# Altium footprint library PcbLib1.PcbLib: 62 footprints (part 2 of 4)
Each footprint in its own frame and in the unit in brackets; x right, y up, seen from the top. Pads: shape width x height; smd on the part's side, far side on the other; paste and mask are expansions set on the pad; w line width, h text height; cw(c..) or ccw(c..) is an arc to the next point about the centre after c.
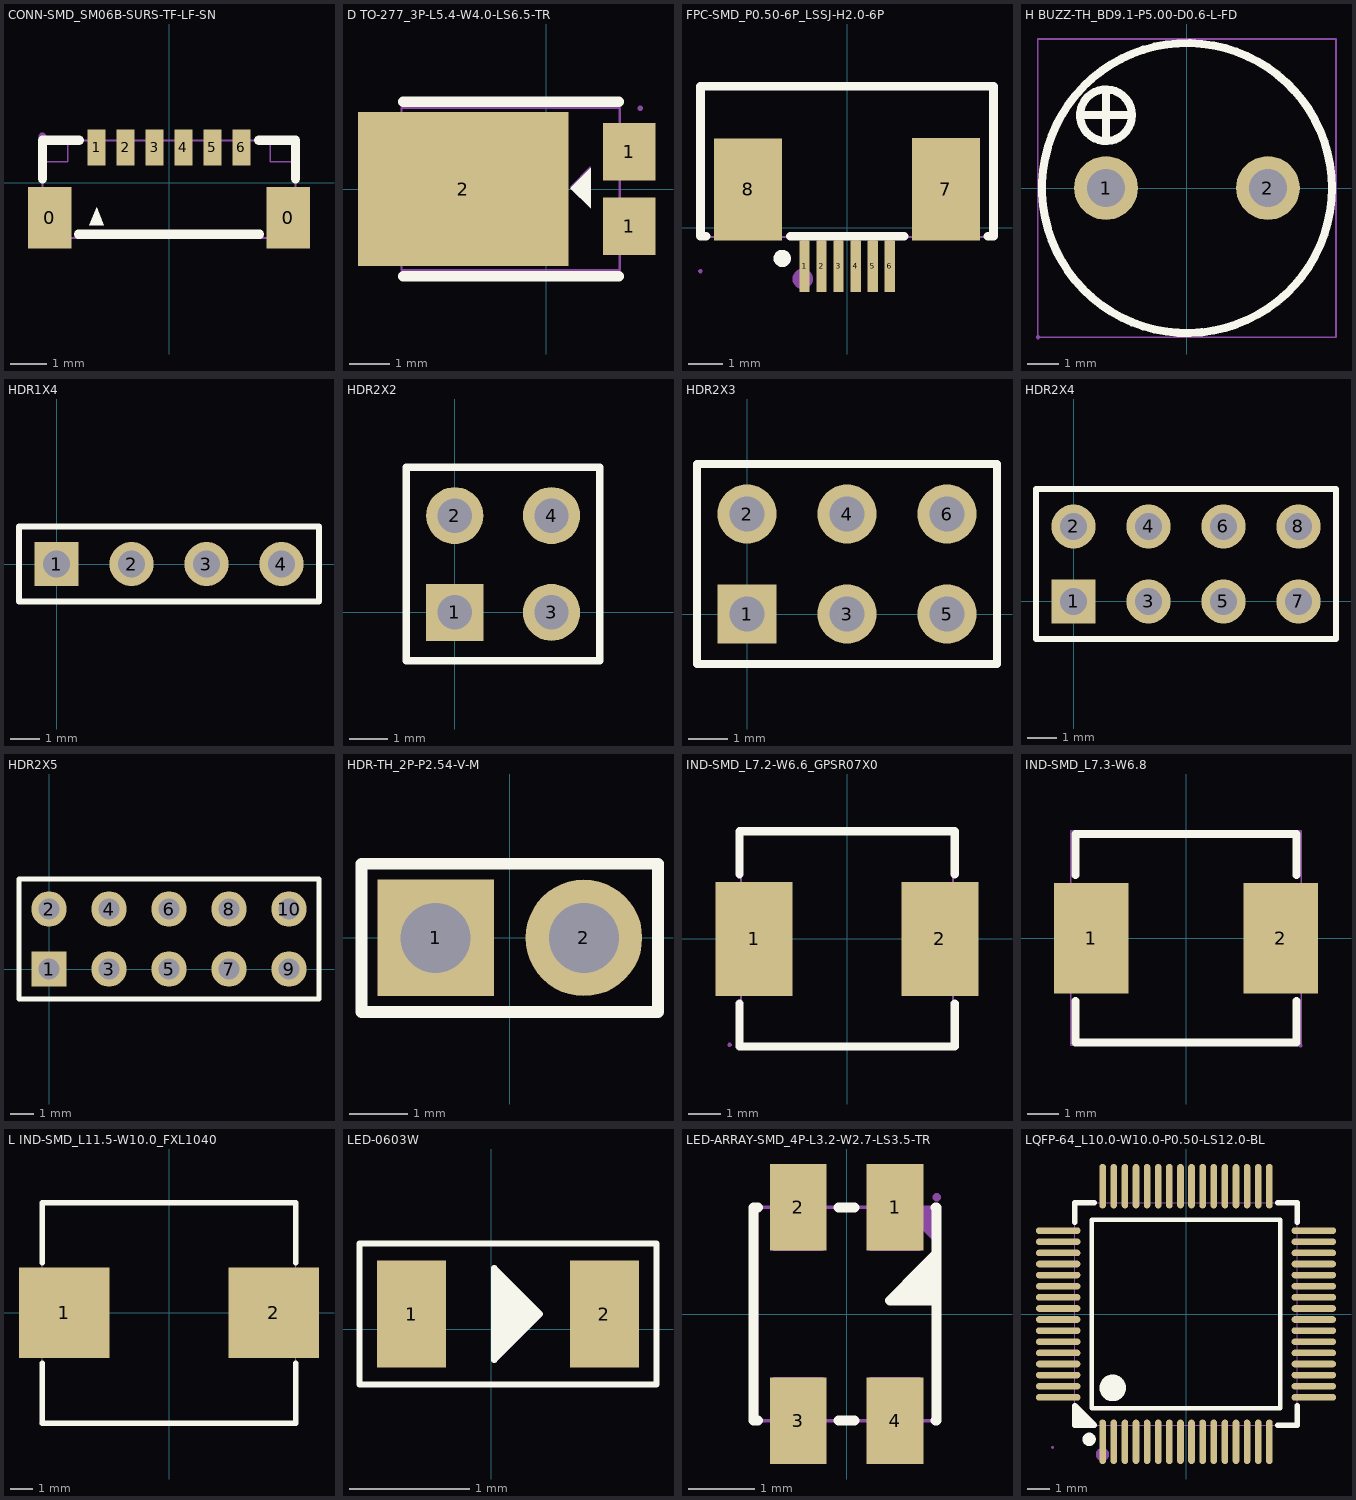
[diagram p1: the footprints below, top view; thin cyan lines are the x and y axes]

## CONN-SMD_SM06B-SURS-TF-LF-SN [mm]
pads (8):
  rect 1.2x1.7 smd: 0(-3.3,-0.975) 0(3.3,-0.975)
  rect 0.5x1 smd: 1(-2,0.975) 2(-1.2,0.975) 3(-0.4,0.975) 4(0.4,0.975) 5(1.2,0.975) 6(2,0.975)
Top Overlay:
  region: -2.2,-1.175 -1.8,-1.175 -2,-0.675
  lines w0.254: -3.5,0.106 -3.5,1.175 -2.481,1.175 ; -2.5,-1.425 2.5,-1.425 ; 2.481,1.175 3.5,1.175 3.5,0.106
Mechanical 15:
  region: -3.3,-1.53 -3.5,-1.53 -3.5,-0.53 -3.3,-0.53
  region: 3.3,-0.53 3.5,-0.53 3.5,-1.53 3.3,-1.53
  region: -2.1,1.275 -1.9,1.275 -1.9,0.675 -2.1,0.675
  region: -1.3,1.275 -1.1,1.275 -1.1,0.675 -1.3,0.675
  region: -0.5,1.275 -0.3,1.275 -0.3,0.675 -0.5,0.675
  region: 0.3,1.275 0.5,1.275 0.5,0.675 0.3,0.675
  region: 1.1,1.275 1.3,1.275 1.3,0.675 1.1,0.675
  region: 1.9,1.275 2.1,1.275 2.1,0.675 1.9,0.675
  region: -3.4,1.275 -3.4,1.316 -3.459,1.375 -3.541,1.375 -3.6,1.316 -3.6,1.275 -3.6,1.234 -3.541,1.175 -3.459,1.175 -3.4,1.234
  lines w0.051: -3.5,-1.53 -3.5,0.58 -2.8,0.58 -2.8,1.17 2.8,1.17 2.8,0.58 3.5,0.58 3.5,-1.53 -3.5,-1.53

## D TO-277_3P-L5.4-W4.0-LS6.5-TR [mm]
pads (3):
  rect 1.29x1.422 smd mask+0.051: 1(2.054,-0.92) 1(2.054,0.92)
  rect 5.2x3.8 smd mask+0.051: 2(-2.054,0)
Top Overlay:
  region: 0.599,0.02 1.099,0.52 1.099,-0.48
  lines w0.254: -3.537,-2.159 1.797,-2.159 ; -3.537,2.159 1.797,2.159
Mechanical 6:
  region: 0.589,0.06 1.089,0.56 1.089,-0.44
Mechanical 15:
  region: 2.387,2 2.387,2.025 2.352,2.06 2.302,2.06 2.267,2.025 2.267,2 2.267,1.975 2.302,1.94 2.352,1.94 2.387,1.975 2.387,2
  region: -3.401,-0.86 -4.221,-0.86 -4.221,0.94 -3.401,0.94 -3.401,1.6 0.179,1.6 0.179,-1.48 -3.401,-1.48
  region: 1.777,-0.47 2.327,-0.47 2.327,-1.37 1.777,-1.37
  region: 1.777,1.37 2.327,1.37 2.327,0.47 1.777,0.47
  lines w0.051: -3.581,-2 -3.581,2 1.819,2 1.819,-2 -3.581,-2
3D body "TO-277B.STEP": height 1.2, standoff 0, extent -4.445,-2.375 2.305,2.375

## FPC-SMD_P0.50-6P_LSSJ-H2.0-6P [mm]
pads (8):
  rect 0.3x1.5 smd: 1(-1.245,-1.13) 2(-0.745,-1.13) 3(-0.245,-1.13) 4(0.255,-1.13) 5(0.755,-1.13) 6(1.255,-1.13)
  rect 2x3 smd: 7(2.901,1.13) 8(-2.901,1.124)
Top Overlay:
  circle w0.254: c-1.9,-0.9 r0.127
  lines w0.254: -4.133,-0.246 -4.3,-0.246 -4.3,4.154 4.3,4.154 4.3,-0.246 4.132,-0.246 ; -1.669,-0.246 1.671,-0.246
Mechanical 6:
  circle w0.3: c-1.3,-1.5 r0.15
Mechanical 15:
  region: 1.95,2.356 3.75,2.356 3.75,-0.265 1.95,-0.265
  region: -3.751,2.35 -1.951,2.35 -1.951,-0.271 -3.751,-0.271
  region: -1.345,-0.221 -1.145,-0.221 -1.145,-1.271 -1.345,-1.271
  region: -0.845,-0.221 -0.645,-0.221 -0.645,-1.271 -0.845,-1.271
  region: -0.345,-0.221 -0.145,-0.221 -0.145,-1.271 -0.345,-1.271
  region: 0.155,-0.221 0.355,-0.221 0.355,-1.271 0.155,-1.271
  region: 0.655,-0.221 0.855,-0.221 0.855,-1.271 0.655,-1.271
  region: 1.155,-0.221 1.355,-0.221 1.355,-1.271 1.155,-1.271
  region: -4.24,-1.271 -4.24,-1.246 -4.275,-1.211 -4.325,-1.211 -4.36,-1.246 -4.36,-1.271 -4.36,-1.296 -4.325,-1.331 -4.275,-1.331 -4.24,-1.296
  lines w0.051: -4.3,-0.271 4.3,-0.271 4.3,4.129 -4.3,4.129 -4.3,-0.271
3D body "SMD,P=0.5mm.STEP": height 2.01, standoff 0, extent -4.3,-1.717 4.3,3.683

## H BUZZ-TH_BD9.1-P5.00-D0.6-L-FD [mm]
pads (2):
  round 2 hole 1.2 mask+0.051: 1(-2.54,0) 2(2.54,0)
Top Overlay:
  circle w0.254: c0,0 r4.55
  circle w0.254: c-2.54,2.286 r0.813
  lines w0.254: -3.302,2.286 -1.778,2.286 ; -2.54,1.524 -2.54,3.048
Mechanical 15:
  region: -2.04,0 -2.04,0.099 -2.116,0.283 -2.257,0.424 -2.441,0.5 -2.639,0.5 -2.823,0.424 -2.964,0.283 -3.04,0.099 -3.04,0 -3.04,-0.099 -2.964,-0.283 -2.823,-0.424 -2.639,-0.5 -2.441,-0.5 -2.257,-0.424 -2.116,-0.283 -2.04,-0.099 -2.04,0
  region: 3.04,0 3.04,0.099 2.964,0.283 2.823,0.424 2.639,0.5 2.441,0.5 2.257,0.424 2.116,0.283 2.04,0.099 2.04,0 2.04,-0.099 2.116,-0.283 2.257,-0.424 2.441,-0.5 2.639,-0.5 2.823,-0.424 2.964,-0.283 3.04,-0.099 3.04,0
  region: -4.617,-4.677 -4.617,-4.652 -4.652,-4.617 -4.702,-4.617 -4.737,-4.652 -4.737,-4.677 -4.737,-4.702 -4.702,-4.737 -4.652,-4.737 -4.617,-4.702 -4.617,-4.677
  lines w0.051: -4.677,-4.677 4.677,-4.677 4.677,4.677 -4.677,4.677 -4.677,-4.677
3D body "插件,D=9.1mm.STEP": height 4.2, standoff -4.5, extent -4.55,-4.55 4.55,4.55

## HDR1X4 [mm] "Connector; Header; 4 Position"
pads (4):
  rect 1.5x1.5 hole 0.9: 1(0,0)
  round 1.5 hole 0.9: 2(2.54,0) 3(5.08,0) 4(7.62,0)
Top Overlay:
  lines w0.2: -1.27,-1.27 -1.27,1.27 8.89,1.27 8.89,-1.27 -1.27,-1.27

## HDR2X2 [mm] "Connector; Header; 2x2 Position"
pads (4):
  rect 1.5x1.5 hole 0.9: 1(0,0)
  round 1.5 hole 0.9: 2(0,2.54) 3(2.54,0) 4(2.54,2.54)
Top Overlay:
  lines w0.2: -1.27,-1.27 -1.27,3.81 3.81,3.81 3.81,-1.27 -1.27,-1.27

## HDR2X3 [mm] "Connector; Header; 3x2 Position"
pads (6):
  rect 1.5x1.5 hole 0.9: 1(0,0)
  round 1.5 hole 0.9: 2(0,2.54) 3(2.54,0) 4(2.54,2.54) 5(5.08,0) 6(5.08,2.54)
Top Overlay:
  lines w0.2: 1.482,-1.27 6.35,-1.27 ; 6.35,-1.27 -1.27,-1.27 -1.27,3.81 6.35,3.81 6.35,-1.27

## HDR2X4 [mm] "Connector; Header; 4x2 Position"
pads (8):
  rect 1.5x1.5 hole 0.9: 1(0,0)
  round 1.5 hole 0.9: 2(0,2.54) 3(2.54,0) 4(2.54,2.54) 5(5.08,0) 6(5.08,2.54) 7(7.62,0) 8(7.62,2.54)
Top Overlay:
  lines w0.2: -1.27,-1.27 8.89,-1.27 8.89,3.81 -1.27,3.81 -1.27,-1.27

## HDR2X5 [mm] "Connector; Header; 5x2 Position"
pads (10):
  rect 1.5x1.5 hole 0.9: 1(0,0)
  round 1.5 hole 0.9: 2(0,2.54) 3(2.54,0) 4(2.54,2.54) 5(5.08,0) 6(5.08,2.54) 7(7.62,0) 8(7.62,2.54) 9(10.16,0) 10(10.16,2.54)
Top Overlay:
  lines w0.2: -1.27,-1.27 11.43,-1.27 11.43,3.81 -1.27,3.81 -1.27,-1.27

## HDR-TH_2P-P2.54-V-M [mm]
pads (2):
  rect 2x2 hole 1.2: 1(-1.27,0)
  round 2 hole 1.2: 2(1.27,0)
Top Overlay:
  lines w0.203: -2.54,-1.27 2.54,-1.27 2.54,1.27 -0.635,1.27 -2.54,1.27 -2.54,-1.27
Mechanical 15:
  region: -2.48,-1.25 -2.48,-1.225 -2.515,-1.19 -2.565,-1.19 -2.6,-1.225 -2.6,-1.25 -2.6,-1.275 -2.565,-1.31 -2.515,-1.31 -2.48,-1.275
  region: 0.95,0.32 1.59,0.32 1.59,-0.32 0.95,-0.32
  region: -1.59,0.32 -0.95,0.32 -0.95,-0.32 -1.59,-0.32
  lines w0.051: -2.54,-1.25 -2.54,1.25 2.54,1.25 2.54,-1.25 -2.54,-1.25
3D body "插件,P=2.54mm.STEP": height 8.5, standoff -3, extent -2.54,-1.27 2.55,1.27

## IND-SMD_L7.2-W6.6_GPSR07X0 [mm] "10uh电感"
pads (2):
  rect 2.35x3.5 smd: 1(-2.85,0) 2(2.85,0)
Top Overlay:
  lines w0.254: -3.3,-1.981 -3.3,-3.3 3.3,-3.3 3.3,-1.981 ; -3.3,1.981 -3.3,3.3 3.3,3.3 3.3,1.981
Mechanical 15:
  region: -1.9,-1.5 -3.6,-1.5 -3.6,1.5 -1.9,1.5
  region: 1.9,1.5 3.6,1.5 3.6,-1.5 1.9,-1.5
  region: -3.54,-3.25 -3.54,-3.225 -3.575,-3.19 -3.625,-3.19 -3.66,-3.225 -3.66,-3.25 -3.66,-3.275 -3.625,-3.31 -3.575,-3.31 -3.54,-3.275
  lines w0.051: -3.25,-3.25 -3.25,3.25 3.25,3.25 3.25,-3.25 -3.25,-3.25
3D body "0630.STEP": height 2.9, standoff 0, extent -3.55,-3.3 3.55,3.3

## IND-SMD_L7.3-W6.8 [mm] "功率电感"
pads (2):
  rect 2.35x3.5 smd: 1(-3,0) 2(3,0)
Top Overlay:
  lines w0.254: -3.5,-2 -3.5,-3.3 3.5,-3.3 3.5,-2 ; -3.5,2 -3.5,3.3 3.5,3.3 3.5,2
Mechanical 15:
  region: 3.68,-3.4 3.68,-3.375 3.645,-3.34 3.595,-3.34 3.56,-3.375 3.56,-3.4 3.56,-3.425 3.595,-3.46 3.645,-3.46 3.68,-3.425
  region: 2.05,1.45 3.65,1.45 3.65,-1.45 2.05,-1.45
  region: -3.65,1.45 -2.05,1.45 -2.05,-1.45 -3.65,-1.45
  lines w0.051: -3.65,-3.4 -3.65,3.4 3.65,3.4 3.65,-3.4 -3.65,-3.4

## L IND-SMD_L11.5-W10.0_FXL1040 [mm]
pads (2):
  rect 4.1x4.1 smd mask+0.051: 1(-4.75,0) 2(4.75,0)
Top Overlay:
  lines w0.254: -5.75,-2.281 -5.75,-5 5.75,-5 5.75,-2.281 ; -5.75,2.281 -5.75,5 5.75,5 5.75,2.281
Mechanical 15:
  region: -5.65,-5 -5.65,-4.959 -5.709,-4.9 -5.791,-4.9 -5.85,-4.959 -5.85,-5 -5.85,-5.041 -5.791,-5.1 -5.709,-5.1 -5.65,-5.041 -5.65,-5
  region: -5.75,-1.5 -5.75,1.5 -3.75,1.5 -3.75,-1.5
  region: 3.75,-1.5 3.75,1.5 5.75,1.5 5.75,-1.5
  lines w0.051: -5.75,-5 5.75,-5 5.75,5 -5.75,5 -5.75,-5

## LED-0603W [mil]
pads (2):
  rect 22.44x35 smd: 1(-26,5) 2(37,5)
Top Overlay:
  lines w2: 2,17 2,-7 3,-7 3,17 4,16 4,-5 5,-4 5,14 6,13 6,-4 8,-2 8,12 7,13 7,-2 9,0 9,11 10,10 10,1 12,3 ; 6,3 8,5 10,7 12,7 ; 12,3 12,6 12,5 15,5 14,6 13,5 13,3 13,6 12,7 ; 12,3 11,2 11,8 12,7 ; 12,3 12,7 ; -43,-18 54,-18 54,28 -43,28 -43,-18 ; 1,-10 1,20 16,5 1,-10
3D body "15.STEP": height 23.82, standoff -0.04, extent -25.5,-10 37.5,21.58

## LED-ARRAY-SMD_4P-L3.2-W2.7-LS3.5-TR [mm]
pads (4):
  rect 0.85x1.3 smd mask+0.05: 1(0.725,1.6) 2(-0.725,1.6) 3(-0.725,-1.6) 4(0.725,-1.6)
Top Overlay:
  region: 1.341,0.903 1.341,0.203 0.641,0.203
  lines w0.152: -1.33,-1.6 -1.4,-1.6 -1.4,1.6 -1.33,1.6 ; -0.12,-1.6 0.12,-1.6 ; -0.12,1.6 0.12,1.6 ; 1.33,-1.6 1.35,-1.6 1.35,1.6 1.33,1.6 ; 1.35,0.2 0.65,0.2 0.65,0.204 1.131,0.684 1.342,0.896 1.35,0.896
Mechanical 6:
  region: 1.35,1.6 0.8,1.6 1.35,1.05
  region: 0.5,1 0.5,1.65 0.6,1.65 0.6,1
  region: -0.8,-1.625 -0.8,-0.975 -0.7,-0.975 -0.7,-1.625
  region: -0.85,0.975 -0.85,1.625 -0.75,1.625 -0.75,0.975
  region: 0.7,-1.725 0.7,-1.075 0.8,-1.075 0.8,-1.725
  region: 1.075,-1.45 0.425,-1.45 0.425,-1.35 1.075,-1.35
Mechanical 15:
  region: 1.41,1.75 1.41,1.775 1.375,1.81 1.325,1.81 1.29,1.775 1.29,1.75 1.29,1.725 1.325,1.69 1.375,1.69 1.41,1.725 1.41,1.75
  region: 0.35,-1.75 0.35,-0.95 1.1,-0.95 1.1,-1.75
  region: 0.35,0.95 0.35,1.75 1.1,1.75 1.1,0.95
  region: -1.1,0.95 -1.1,1.75 -0.35,1.75 -0.35,0.95
  region: -1.1,-1.75 -1.1,-0.95 -0.35,-0.95 -0.35,-1.75
  lines w0.051: -1.35,-1.6 1.35,-1.6 1.35,1.6 -1.35,1.6 -1.35,-1.6
3D body "CASE-B-3528.STEP": height 1.97, standoff -0.03, extent -1.4,-1.85 1.4,1.85

## LQFP-64_L10.0-W10.0-P0.50-LS12.0-BL [mm]
pads (64):
  oval 0.3x2 smd: 1(-3.75,-5.75) 2(-3.25,-5.75) 3(-2.75,-5.75) 4(-2.25,-5.75) 5(-1.75,-5.75) 6(-1.25,-5.75) 7(-0.75,-5.75) 8(-0.25,-5.75) 9(0.25,-5.75) 10(0.75,-5.75) 11(1.25,-5.75) 12(1.75,-5.75) 13(2.25,-5.75) 14(2.75,-5.75) 15(3.25,-5.75) 16(3.75,-5.75) 33(3.75,5.75) 34(3.25,5.75) 35(2.75,5.75) 36(2.25,5.75) 37(1.75,5.75) 38(1.25,5.75) 39(0.75,5.75) 40(0.25,5.75) 41(-0.25,5.75) 42(-0.75,5.75) 43(-1.25,5.75) 44(-1.75,5.75) 45(-2.25,5.75) 46(-2.75,5.75) 47(-3.25,5.75) 48(-3.75,5.75)
  oval 2x0.3 smd: 17(5.75,-3.75) 18(5.75,-3.25) 19(5.75,-2.75) 20(5.75,-2.25) 21(5.75,-1.75) 22(5.75,-1.25) 23(5.75,-0.75) 24(5.75,-0.25) 25(5.75,0.25) 26(5.75,0.75) 27(5.75,1.25) 28(5.75,1.75) 29(5.75,2.25) 30(5.75,2.75) 31(5.75,3.25) 32(5.75,3.75) 49(-5.75,3.75) 50(-5.75,3.25) 51(-5.75,2.75) 52(-5.75,2.25) 53(-5.75,1.75) 54(-5.75,1.25) 55(-5.75,0.75) 56(-5.75,0.25) 57(-5.75,-0.25) 58(-5.75,-0.75) 59(-5.75,-1.25) 60(-5.75,-1.75) 61(-5.75,-2.25) 62(-5.75,-2.75) 63(-5.75,-3.25) 64(-5.75,-3.75)
Top Overlay:
  region: -4.131,-5 -5,-4.131 -5,-5
  lines w0.2: -4.25,-4.25 -4.25,4.25 4.25,4.25 4.25,-4.25 -4.25,-4.25
  lines w0.254: -5,4.131 -5,5 -4.131,5 ; 4.131,-5 5,-5 5,-4.131 ; 4.131,5 5,5 5,4.131 ; -5,-4.131 -5,-4.131 ; -5,-4.131 -4.131,-5 -5,-5 -5,-4.131
  lines w0.3: -4.361,-5.49 ccw(c-4.36,-5.64) -4.359,-5.49
  lines w0.6: -3.299,-3.025 ccw(c-3.297,-3.325) -3.294,-3.025
Mechanical 6:
  circle w0.3: c-3.76,-6.32 r0.15
Mechanical 15:
  drawing of 133 lines, arcs and shapes, not listed